# Altium footprint library microbuilder.PCBLIB: 422 footprints (part 7 of 27)
Each footprint in its own frame and in the unit in brackets; x right, y up, seen from the top. Pads: shape width x height; smd on the part's side, far side on the other; paste and mask are expansions set on the pad; w line width, h text height; cw(c..) or ccw(c..) is an arc to the next point about the centre after c.
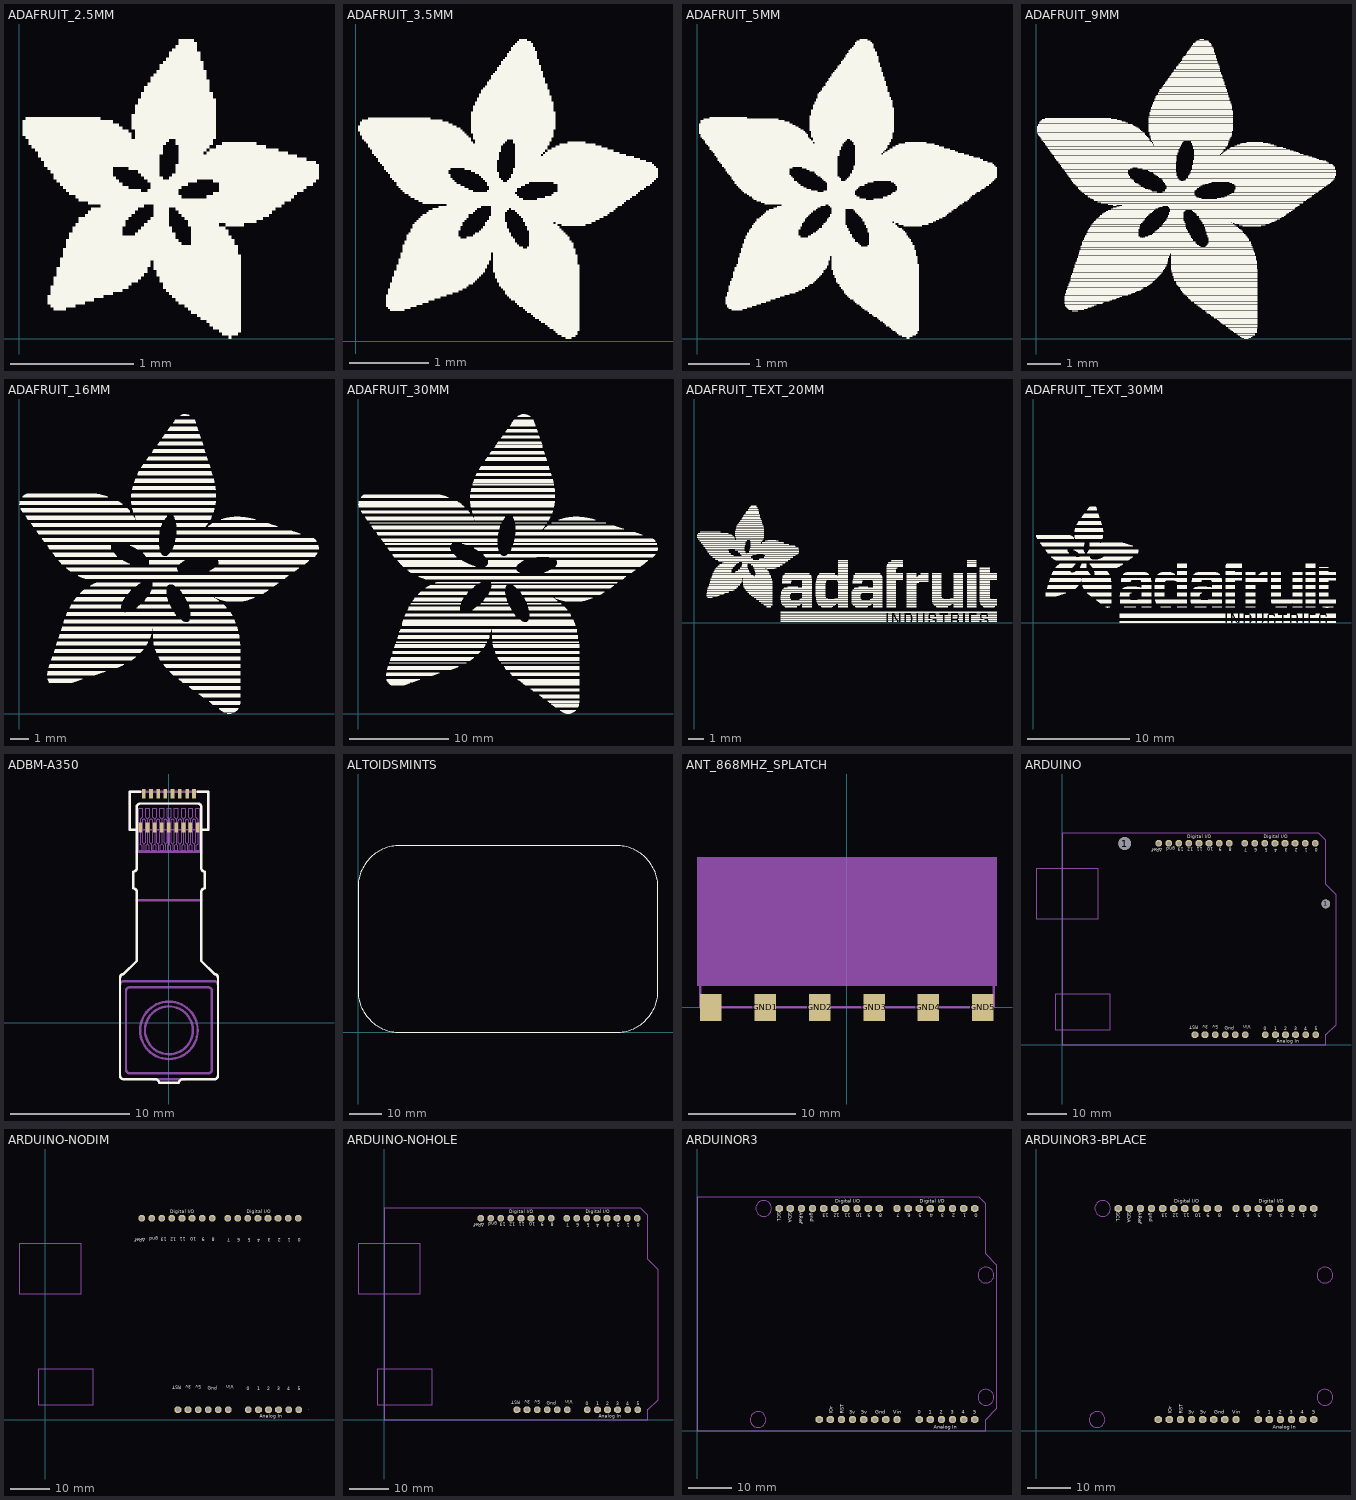
[diagram p6: the footprints below, top view; thin cyan lines are the x and y axes]

## ADAFRUIT_2.5MM [mil]
Top Overlay:
  drawing of 1191 lines, arcs and shapes, not listed

## ADAFRUIT_3.5MM [mil]
Top Overlay:
  drawing of 1122 lines, arcs and shapes, not listed

## ADAFRUIT_5MM [mil]
Top Overlay:
  drawing of 1191 lines, arcs and shapes, not listed

## ADAFRUIT_9MM [mil]
Top Overlay:
  drawing of 1191 lines, arcs and shapes, not listed

## ADAFRUIT_16MM [mil]
Top Overlay:
  drawing of 1191 lines, arcs and shapes, not listed

## ADAFRUIT_30MM [mil]
Top Overlay:
  drawing of 1191 lines, arcs and shapes, not listed

## ADAFRUIT_TEXT_20MM [mil]
Top Overlay:
  drawing of 2896 lines, arcs and shapes, not listed

## ADAFRUIT_TEXT_30MM [mil]
Top Overlay:
  drawing of 2896 lines, arcs and shapes, not listed

## ADBM-A350 [mil]
pads (17):
  rect 12x32 smd: 1(-94.49,645) 2(-82.68,756) 3(-70.87,645) 4(-59.06,756) 5(-47.24,645) 6(-35.43,756) 7(-23.62,645) 8(-11.81,756) 9(0,645) 10(12,756) 11(24,645) 12(36,756) 13(48,645) 14(60,756) 15(71,645) 16(83,756) 17(95,645)
Top Overlay:
  lines w8: -108.27,638 -129.92,638 -129.92,763 -94.49,763 ; 95,763 130,763 130,638 109,638 ; -161.42,-174.61 ccw(c-149.61,-174.61) -149.61,-186.42 -51.18,-186.42 cw(c-47.24,-202.17) -31.5,-198.23 32,-198.23 cw(c47.91,-202.32) 52,-186.42 150,-186.42 ccw(c150.09,-174.51) 162,-174.61 162,149 ccw(c150,149) 150,161 107,204 107,432 cw(c119,432) 119,444 119,499 cw(c119,511) 107,511 107,710 ccw(c95,712) 97,724 -96.46,724 ccw(c-94.38,712.08) -106.3,710 -106.3,511 cw(c-118.2,510.91) -118.11,499 -118.11,444 cw(c-118.2,432.09) -106.3,432 -106.3,204 -149.61,161 ccw(c-149.51,149.09) -161.42,149 -161.42,-174.61
Mechanical 16:
  drawing of 193 lines, arcs and shapes, not listed

## ALTOIDSMINTS [mil]
Top Overlay:
  lines w8: 0,500 0,1740 cw(c500.5,1740.5) 500,2241 3100,2241 cw(c3099.5,1740.5) 3600,1740 3600,500 cw(c3100,500) 3100,0 500,0 cw(c500,500) 0,500
Mechanical 16:
  text "91.44mm" at 3533,994 h77.5
  text "56.9mm" at 1654,2136 h77.5

## ANT_868MHZ_SPLATCH [mil]
pads (6):
  rect 79x99 smd: GND1(-300,0) GND2(-100,0) GND3(100,0) GND4(300,0) GND5(500,0) MICROSTRIP(-500,0)
Mechanical 16:
  lines w8: -539.37,0 540,0 540,540 -539.37,540 -539.37,0
Mechanical 27:
  rectangle: -551.18,79 552,552
Mechanical 28:
  rectangle: -551.18,79 552,552

## ARDUINO [mil]
pads (30):
  round 126 hole 126: 1(621,1999)
  round 87 hole 87: 1(2621,1399)
  oct 66x66 hole 40: 3V(1420,100) 5V(1520,100) A0(2020,100) A1(2120,100) A2(2220,100) A3(2320,100) A4(2420,100) A5(2520,100) AREF(960,2000) D0(2515,2000) D1(2415,2000) D2(2315,2000) D3(2215,2000) D4(2115,2000) D5(2015,2000) D6(1915,2000) D7(1815,2000) D8(1660,2000) D9(1560,2000) D10(1460,2000) D11(1360,2000) D12(1260,2000) D13(1160,2000) GND(1060,2000) GND1(1720,100) GND2(1620,100) RESET(1320,100) VIN(1820,100)
Top Overlay:
  lines w0: 2620,98 2621,98
  text "RST" at 1351,189 h34
  text "3v" at 1452,191 h34
  text "5v" at 1552,191 h34
  text "Gnd" at 1616,149 h34
  text "Vin" at 1877,191 h34
  text "Analog In" at 2131,19 h34
  text "0" at 2006,144 h34
  text "1" at 2106,144 h34
  text "2" at 2206,144 h34
  text "3" at 2306,144 h34
  text "4" at 2406,144 h34
  text "5" at 2511,144 h34
  text "ARef" at 996,1954 h34
  text "gnd" at 1122,1961 h34
  text "13" at 1207,1956 h34
  text "12" at 1302,1956 h34
  text "11" at 1397,1961 h34
  text "10" at 1502,1961 h34
  text "9" at 1587,1956 h34
  text "8" at 1687,1956 h34
  text "7" at 1842,1951 h34
  text "6" at 1937,1951 h34
  text "5" at 2042,1951 h34
  text "4" at 2137,1946 h34
  text "3" at 2242,1951 h34
  text "2" at 2342,1951 h34
  text "1" at 2442,1951 h34
  text "0" at 2542,1951 h34
  text "Digital I/O" at 1245,2050 h34
  text "Digital I/O" at 2005,2050 h34
Mechanical 1:
  lines w0: 2620,98 2620,0 0,0 0,1250 0,2100 2553,2100 2620,2033 2620,1594 2722,1492 2722,199 2621,98
Mechanical 30:
  lines w0: -260,1250 -260,1750 360,1750 360,1250 0,1250 -260,1250 ; -70,150 480,150 480,500 -70,500 -70,150

## ARDUINO-NODIM [mil]
pads (28):
  oct 66x66 hole 40: 3V(1420,100) 5V(1520,100) A0(2020,100) A1(2120,100) A2(2220,100) A3(2320,100) A4(2420,100) A5(2520,100) AREF(960,2000) D0(2515,2000) D1(2415,2000) D2(2315,2000) D3(2215,2000) D4(2115,2000) D5(2015,2000) D6(1915,2000) D7(1815,2000) D8(1660,2000) D9(1560,2000) D10(1460,2000) D11(1360,2000) D12(1260,2000) D13(1160,2000) GND(1060,2000) GND1(1720,100) GND2(1620,100) RESET(1320,100) VIN(1820,100)
Top Overlay:
  lines w0: 2620,98 2621,98
  text "RST" at 1351,339 h34
  text "3v" at 1452,341 h34
  text "5v" at 1552,341 h34
  text "Gnd" at 1616,299 h34
  text "Vin" at 1877,341 h34
  text "Analog In" at 2131,19 h34
  text "0" at 2006,294 h34
  text "1" at 2106,294 h34
  text "2" at 2206,294 h34
  text "3" at 2306,294 h34
  text "4" at 2406,294 h34
  text "5" at 2511,294 h34
  text "ARef" at 996,1804 h34
  text "gnd" at 1122,1811 h34
  text "13" at 1207,1806 h34
  text "12" at 1302,1806 h34
  text "11" at 1397,1811 h34
  text "10" at 1502,1811 h34
  text "9" at 1587,1806 h34
  text "8" at 1687,1806 h34
  text "7" at 1842,1801 h34
  text "6" at 1937,1801 h34
  text "5" at 2042,1801 h34
  text "4" at 2137,1796 h34
  text "3" at 2242,1801 h34
  text "2" at 2342,1801 h34
  text "1" at 2442,1801 h34
  text "0" at 2542,1801 h34
  text "Digital I/O" at 1245,2050 h34
  text "Digital I/O" at 2005,2050 h34
Bottom Overlay:
  lines w0: 2620,98 2620,0 0,0 0,2100 2553,2100 2620,2033 2620,1594 2722,1492 2722,199 2621,98
Mechanical 30:
  lines w0: -260,1250 -260,1750 360,1750 360,1250 -260,1250 ; -70,150 480,150 480,500 -70,500 -70,150

## ARDUINO-NOHOLE [mil]
pads (28):
  oct 66x66 hole 40: 3V(1420,100) 5V(1520,100) A0(2020,100) A1(2120,100) A2(2220,100) A3(2320,100) A4(2420,100) A5(2520,100) AREF(960,2000) D0(2515,2000) D1(2415,2000) D2(2315,2000) D3(2215,2000) D4(2115,2000) D5(2015,2000) D6(1915,2000) D7(1815,2000) D8(1660,2000) D9(1560,2000) D10(1460,2000) D11(1360,2000) D12(1260,2000) D13(1160,2000) GND(1060,2000) GND1(1720,100) GND2(1620,100) RESET(1320,100) VIN(1820,100)
Top Overlay:
  lines w0: 2620,98 2621,98
  text "RST" at 1351,189 h34
  text "3v" at 1452,191 h34
  text "5v" at 1552,191 h34
  text "Gnd" at 1616,149 h34
  text "Vin" at 1877,191 h34
  text "Analog In" at 2131,19 h34
  text "0" at 2006,144 h34
  text "1" at 2106,144 h34
  text "2" at 2206,144 h34
  text "3" at 2306,144 h34
  text "4" at 2406,144 h34
  text "5" at 2511,144 h34
  text "ARef" at 996,1954 h34
  text "gnd" at 1122,1961 h34
  text "13" at 1207,1956 h34
  text "12" at 1302,1956 h34
  text "11" at 1397,1961 h34
  text "10" at 1502,1961 h34
  text "9" at 1587,1956 h34
  text "8" at 1687,1956 h34
  text "7" at 1842,1951 h34
  text "6" at 1937,1951 h34
  text "5" at 2042,1951 h34
  text "4" at 2137,1946 h34
  text "3" at 2242,1951 h34
  text "2" at 2342,1951 h34
  text "1" at 2442,1951 h34
  text "0" at 2542,1951 h34
  text "Digital I/O" at 1245,2050 h34
  text "Digital I/O" at 2005,2050 h34
Mechanical 1:
  lines w0: 2620,98 2620,0 0,0 0,1250 0,2100 2553,2100 2620,2033 2620,1594 2722,1492 2722,199 2621,98
Mechanical 30:
  lines w0: -260,1250 -260,1750 360,1750 360,1250 0,1250 -260,1250 ; -70,150 480,150 480,500 -70,500 -70,150

## ARDUINOR3 [mil]
pads (32):
  oct 66x66 hole 40: 3V(1400,100) 5V(1500,100) A0(2000,100) A1(2100,100) A2(2200,100) A3(2300,100) A4(2400,100) A5(2500,100) AREF(940,2000) D0(2500,2000) D1(2400,2000) D2(2300,2000) D3(2200,2000) D4(2100,2000) D5(2000,2000) D6(1900,2000) D7(1800,2000) D8(1640,2000) D9(1540,2000) D10(1440,2000) D11(1340,2000) D12(1240,2000) D13(1140,2000) GND(1040,2000) GND1(1700,100) GND2(1600,100) IOREF(1200,100) RESERVED(1100,100) RESET(1300,100) SCL(740,2000) SDA(840,2000) VIN(1800,100)
Top Overlay:
  text "RST" at 1320,150 h34
  text "3v" at 1369,150 h34
  text "5v" at 1479,150 h34
  text "Gnd" at 1606,150 h34
  text "Vin" at 1764,150 h34
  text "Analog In" at 2131,19 h34
  text "0" at 1985,150 h34
  text "1" at 2085,150 h34
  text "2" at 2185,150 h34
  text "3" at 2285,150 h34
  text "4" at 2385,150 h34
  text "5" at 2485,150 h34
  text "ARef" at 920,1965 h34
  text "gnd" at 1020,1960 h34
  text "13" at 1185,1950 h34
  text "12" at 1285,1950 h34
  text "11" at 1385,1950 h34
  text "10" at 1485,1950 h34
  text "9" at 1565,1950 h34
  text "8" at 1665,1950 h34
  text "7" at 1825,1950 h34
  text "6" at 1925,1950 h34
  text "5" at 2025,1950 h34
  text "4" at 2125,1950 h34
  text "3" at 2225,1950 h34
  text "2" at 2325,1950 h34
  text "1" at 2425,1950 h34
  text "0" at 2525,1950 h34
  text "Digital I/O" at 1245,2050 h34
  text "Digital I/O" at 2005,2050 h34
  text "SCL" at 720,1965 h34
  text "SDA" at 820,1965 h34
  text "IOr" at 1220,150 h34
Mechanical 1:
  lines w0: 0,0 0,2100 ; 2540,2100 2600,2040 2600,1590 2700,1490 ; 2600,0 2600,100 2700,200
  lines w8: 0,0 2600,0 ; 0,2100 2540,2100 ; 2700,200 2700,1490
Mechanical 16:
  circle w8: c600,2000 r71
  circle w8: c550,100 r71
  circle w8: c2600,1400 r71
  circle w8: c2600,300 r71

## ARDUINOR3-BPLACE [mil]
pads (32):
  oct 66x66 hole 40: 3V(1400,100) 5V(1500,100) A0(2000,100) A1(2100,100) A2(2200,100) A3(2300,100) A4(2400,100) A5(2500,100) AREF(940,2000) D0(2500,2000) D1(2400,2000) D2(2300,2000) D3(2200,2000) D4(2100,2000) D5(2000,2000) D6(1900,2000) D7(1800,2000) D8(1640,2000) D9(1540,2000) D10(1440,2000) D11(1340,2000) D12(1240,2000) D13(1140,2000) GND(1040,2000) GND1(1700,100) GND2(1600,100) IOREF(1200,100) RESERVED(1100,100) RESET(1300,100) SCL(740,2000) SDA(840,2000) VIN(1800,100)
Top Overlay:
  text "RST" at 1320,150 h34
  text "3v" at 1369,150 h34
  text "5v" at 1479,150 h34
  text "Gnd" at 1606,150 h34
  text "Vin" at 1764,150 h34
  text "Analog In" at 2131,19 h34
  text "0" at 1985,150 h34
  text "1" at 2085,150 h34
  text "2" at 2185,150 h34
  text "3" at 2285,150 h34
  text "4" at 2385,150 h34
  text "5" at 2485,150 h34
  text "ARef" at 920,1965 h34
  text "gnd" at 1020,1960 h34
  text "13" at 1185,1950 h34
  text "12" at 1285,1950 h34
  text "11" at 1385,1950 h34
  text "10" at 1485,1950 h34
  text "9" at 1565,1950 h34
  text "8" at 1665,1950 h34
  text "7" at 1825,1950 h34
  text "6" at 1925,1950 h34
  text "5" at 2025,1950 h34
  text "4" at 2125,1950 h34
  text "3" at 2225,1950 h34
  text "2" at 2325,1950 h34
  text "1" at 2425,1950 h34
  text "0" at 2525,1950 h34
  text "Digital I/O" at 1245,2050 h34
  text "Digital I/O" at 2005,2050 h34
  text "SCL" at 720,1965 h34
  text "SDA" at 820,1965 h34
  text "IOr" at 1220,150 h34
Bottom Overlay:
  lines w0: 0,0 2600,0 2600,100 2700,200 2700,1490 2600,1590 2600,2040 2540,2100 0,2100 0,0
Mechanical 16:
  circle w8: c600,2000 r71
  circle w8: c550,100 r71
  circle w8: c2600,1400 r71
  circle w8: c2600,300 r71